# Altium footprint library lib_protel_HC_BOINA.PCBLIB: 726 footprints (part 3 of 46)
Each footprint in its own frame and in the unit in brackets; x right, y up, seen from the top. Pads: shape width x height; smd on the part's side, far side on the other; paste and mask are expansions set on the pad; w line width, h text height; cw(c..) or ccw(c..) is an arc to the next point about the centre after c.
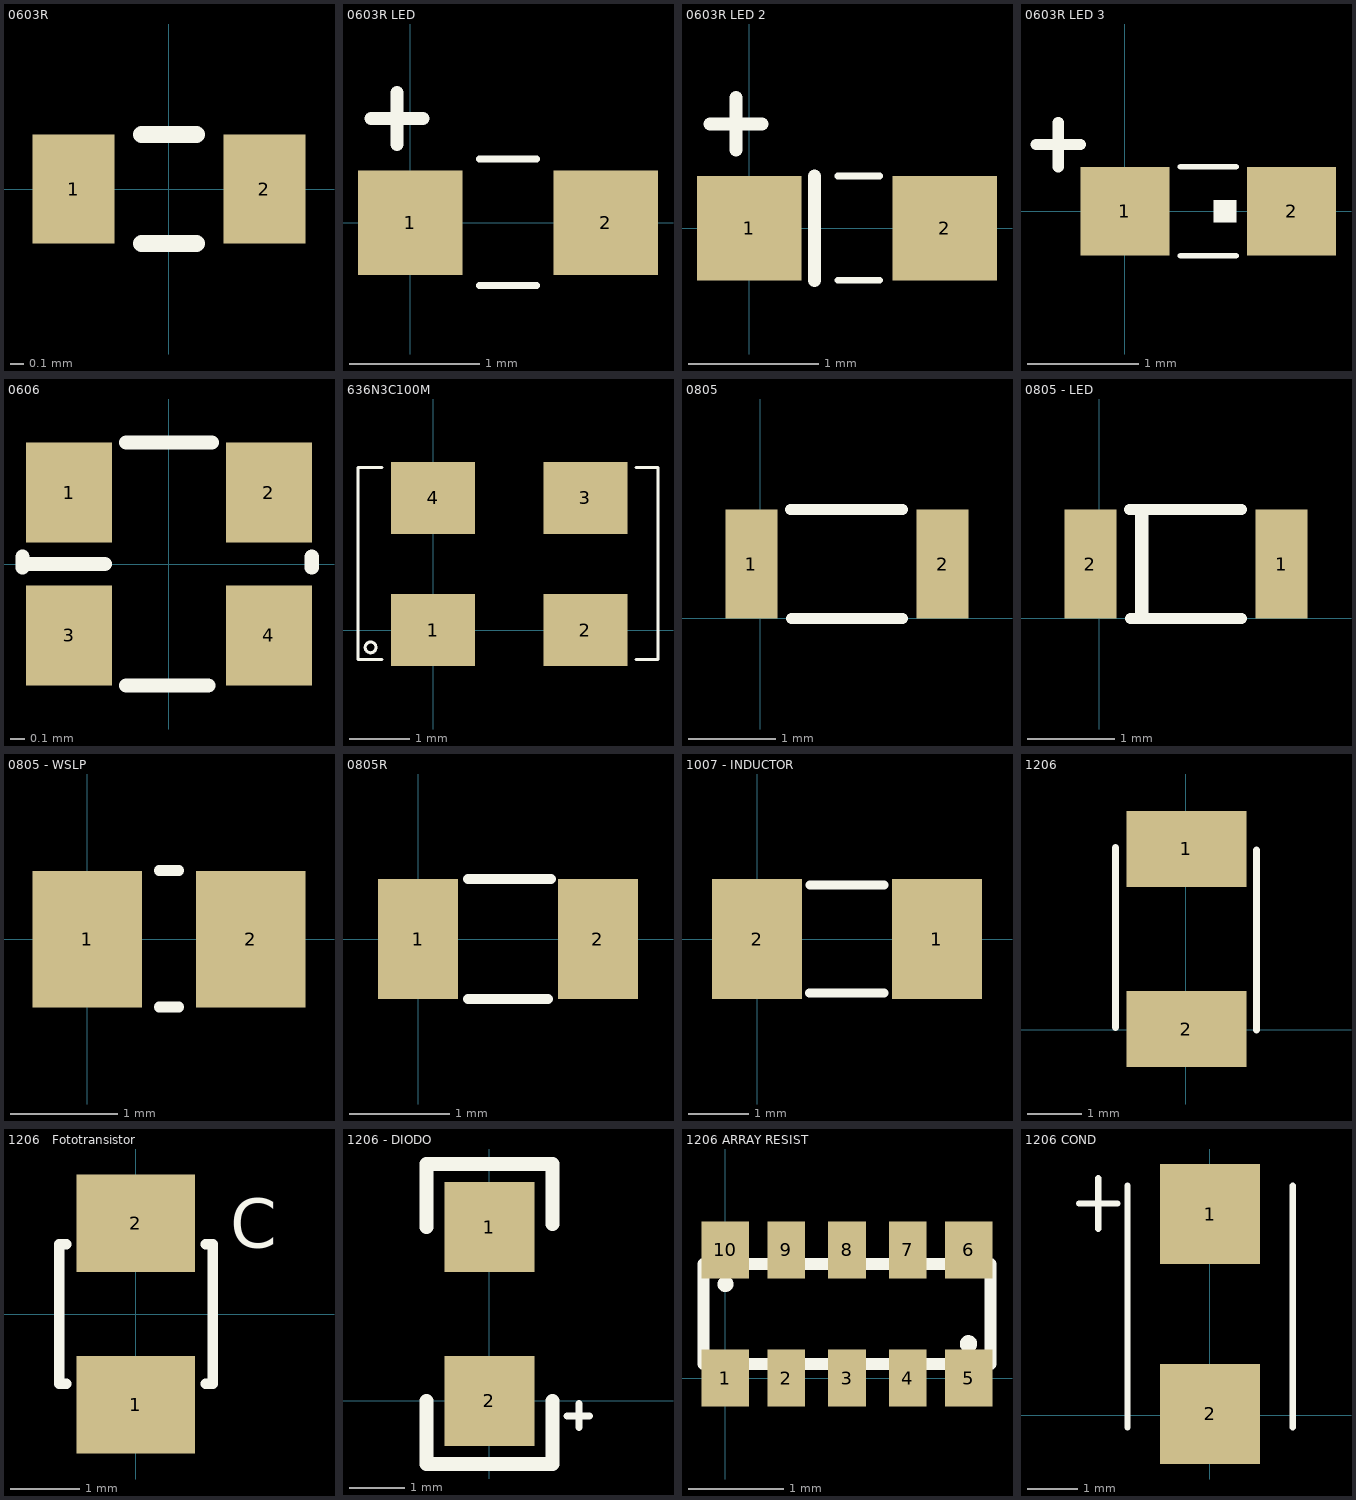
[diagram p2: the footprints below, top view; thin cyan lines are the x and y axes]

## 0603R [mm]
height 0.5
pads (2):
  rect 0.6x0.8 smd: 1(-0.7,0) 2(0.7,0)
Top Overlay:
  lines w0.127: -0.2,-0.4 0.2,-0.4 ; -0.2,0.4 0.2,0.4
3D body "RES0603.STEP": height 0.45, standoff 0, extent -0.75,-0.43 0.8,0.43

## 0603R LED [mm] "LED OSRAM LGQ971"
height 0.9
pads (2):
  rect 0.8x0.8 smd: 1(0,0) 2(1.5,0)
Top Overlay:
  lines w0.051: 0.53,-0.48 0.97,-0.48 ; 0.53,0.49 0.97,0.49
  lines w0.1: -0.3,0.8 0.1,0.8 ; -0.1,0.6 -0.1,1

## 0603R LED 2 [mm] "LED LUMEX SML-LXFP0603SUGCTR"
height 0.2
pads (2):
  rect 0.8x0.8 smd: 1(0,0) 2(1.5,0)
Top Overlay:
  lines w0.051: 0.68,-0.4 1,-0.4 ; 0.68,0.4 1,0.4
  lines w0.1: -0.3,0.8 0.1,0.8 ; -0.1,0.6 -0.1,1 ; 0.5,-0.4 0.5,0.4

## 0603R LED 3 [mm] "LED LITE-ON LTST-C193KRKT-5A"
height 0.35
pads (2):
  rect 0.8x0.8 smd: 1(0,0) 2(1.5,0)
Top Overlay:
  region: 0.8,0.1 0.8,-0.1 1,-0.1 1,0.1
  lines w0.051: 0.5,-0.4 1,-0.4 ; 0.5,0.4 1,0.4
  lines w0.1: -0.8,0.6 -0.4,0.6 ; -0.6,0.4 -0.6,0.8
3D body "User Library-LED_0603_WS.STEP": height 0.6, standoff 0, extent -0.05,-0.4 1.55,0.4

## 0606 [mm]
pads (4):
  rect 0.6x0.7 smd: 1(-0.7,0.5) 2(0.7,0.5) 3(-0.7,-0.5) 4(0.7,-0.5)
Top Overlay:
  lines w0.1: -1.025,-0.025 -1.025,0.05 ; -0.975,0 -0.45,0 ; -0.3,-0.85 0.275,-0.85 ; -0.3,0.85 0.3,0.85 ; 1,-0.025 1,0.05

## 636N3C100M [mm] "CLOCK CTS 636N3C100  100MHz"
height 1.2
pads (4):
  rect 1.4x1.2 smd: 1(0,0) 2(2.54,0) 3(2.54,2.2) 4(0,2.2)
Top Overlay:
  circle w0.051: c-1.04,-0.29 r0.09
  lines w0.051: -0.85,-0.49 -1.25,-0.49 -1.25,2.71 -0.85,2.71 ; 3.38,-0.49 3.75,-0.49 3.75,2.71 3.38,2.71

## 0805 [mm] "footprint 0805"
pads (2):
  rect 0.6x1.25 smd: 1(-0.1,0.625) 2(2.1,0.625)
Top Overlay:
  lines w0.127: 0.35,1.25 1.64,1.25 ; 0.36,0 1.64,0

## 0805 - LED [mm] "footprint 0805 PARA LED"
height 0.8
pads (2):
  rect 0.6x1.25 smd: 1(2.1,0.625) 2(-0.1,0.625)
Top Overlay:
  lines w0.127: 0.35,1.25 1.64,1.25 ; 0.36,0 1.64,0
  lines w0.152: 0.49,0.01 0.49,1.23

## 0805 - WSLP [mm] "footprint 0805"
height 0.33
pads (2):
  rect 1.02x1.27 smd: 1(0,0) 2(1.52,0)
Top Overlay:
  lines w0.1: 0.67,-0.63 0.85,-0.63 ; 0.67,0.64 0.85,0.64

## 0805R [mm] "footprint 0805"
height 0.5
pads (2):
  rect 0.8x1.2 smd: 1(0,0) 2(1.8,0)
Top Overlay:
  lines w0.1: 0.5,-0.6 1.3,-0.6 ; 0.5,0.6 1.33,0.6
3D body "User Library-cap_0805-1.STEP": height 1.2, standoff 0, extent -0.1,-0.6 1.9,0.6

## 1007 - INDUCTOR [mm]
height 1.8
pads (2):
  rect 1.5x2 smd: 1(3,0) 2(0,0)
Top Overlay:
  lines w0.15: 0.875,-0.9 2.115,-0.9 ; 0.88,0.9 2.12,0.9

## 1206 [mm] "footprint LEDS_RESIST 1206"
pads (2):
  rect 2.2x1.4 smd: 1(0.013,3.315) 2(0.013,0.013)
Top Overlay:
  lines w0.127: -1.29,0.038 -1.29,3.34 ; 1.3,-0.002 1.3,3.3
3D body "User Library-RES_3216-1206.step": height 0.85, standoff 0, extent -0.865,-0.075 0.865,3.275

## 1206   Fototransistor [mm]
height 1.1
pads (2):
  rect 1.7x1.4 smd: 1(0,-1.3) 2(0,1.3)
Top Overlay:
  lines w0.15: -1,-1 -1.1,-1 -1.1,1 -1,1 ; 1,-1 1.1,-1 1.1,1 1,1
  text "C" at 1.35,0.95 h0.7
3D body "SML-LXLC1206.stp": height 1.11, standoff 0, extent -0.798,-1.623 0.803,1.583

## 1206 - DIODO [mil]
pads (2):
  rect 64x64 smd: 1(0,124) 2(0,0)
Top Overlay:
  lines w5: 55.31,-10.83 71.46,-10.83 ; 63.98,-19.1 63.98,-1.77
  lines w9.84: -45,0 -45,-45 45,-45 45,0 ; -45,124 -45,169 45,169 45,126

## 1206 ARRAY RESIST [mm]
pads (10):
  rect 0.5x0.6 smd: 1(0,0) 5(2.56,0) 6(2.56,1.35) 10(0,1.35)
  rect 0.4x0.6 smd: 2(0.64,0) 3(1.28,0) 4(1.92,0) 7(1.92,1.35) 8(1.28,1.35) 9(0.64,1.35)
Top Overlay:
  circle w0.127: c2.56,0.36 r0.028
  circle w0.127: c0,0.99 r0.02
  lines w0.127: -0.23,0.15 2.79,0.15 2.79,1.2 -0.23,1.2 -0.23,0.15

## 1206 COND [mm] "FORMATO PARA CONDENSADORES SMD"
pads (2):
  rect 2x2 smd: 1(0.003,4.023) 2(0.003,0.023)
Top Overlay:
  lines w0.127: -2.613,4.233 -1.851,4.233 ; -2.232,3.725 -2.232,4.741 ; -1.648,-0.239 -1.648,4.587 ; 1.654,-0.239 1.654,4.587